# Altium footprint library CM3Board.PcbLib: 127 footprints (part 5 of 8)
Each footprint in its own frame and in the unit in brackets; x right, y up, seen from the top. Pads: shape width x height; smd on the part's side, far side on the other; paste and mask are expansions set on the pad; w line width, h text height; cw(c..) or ccw(c..) is an arc to the next point about the centre after c.
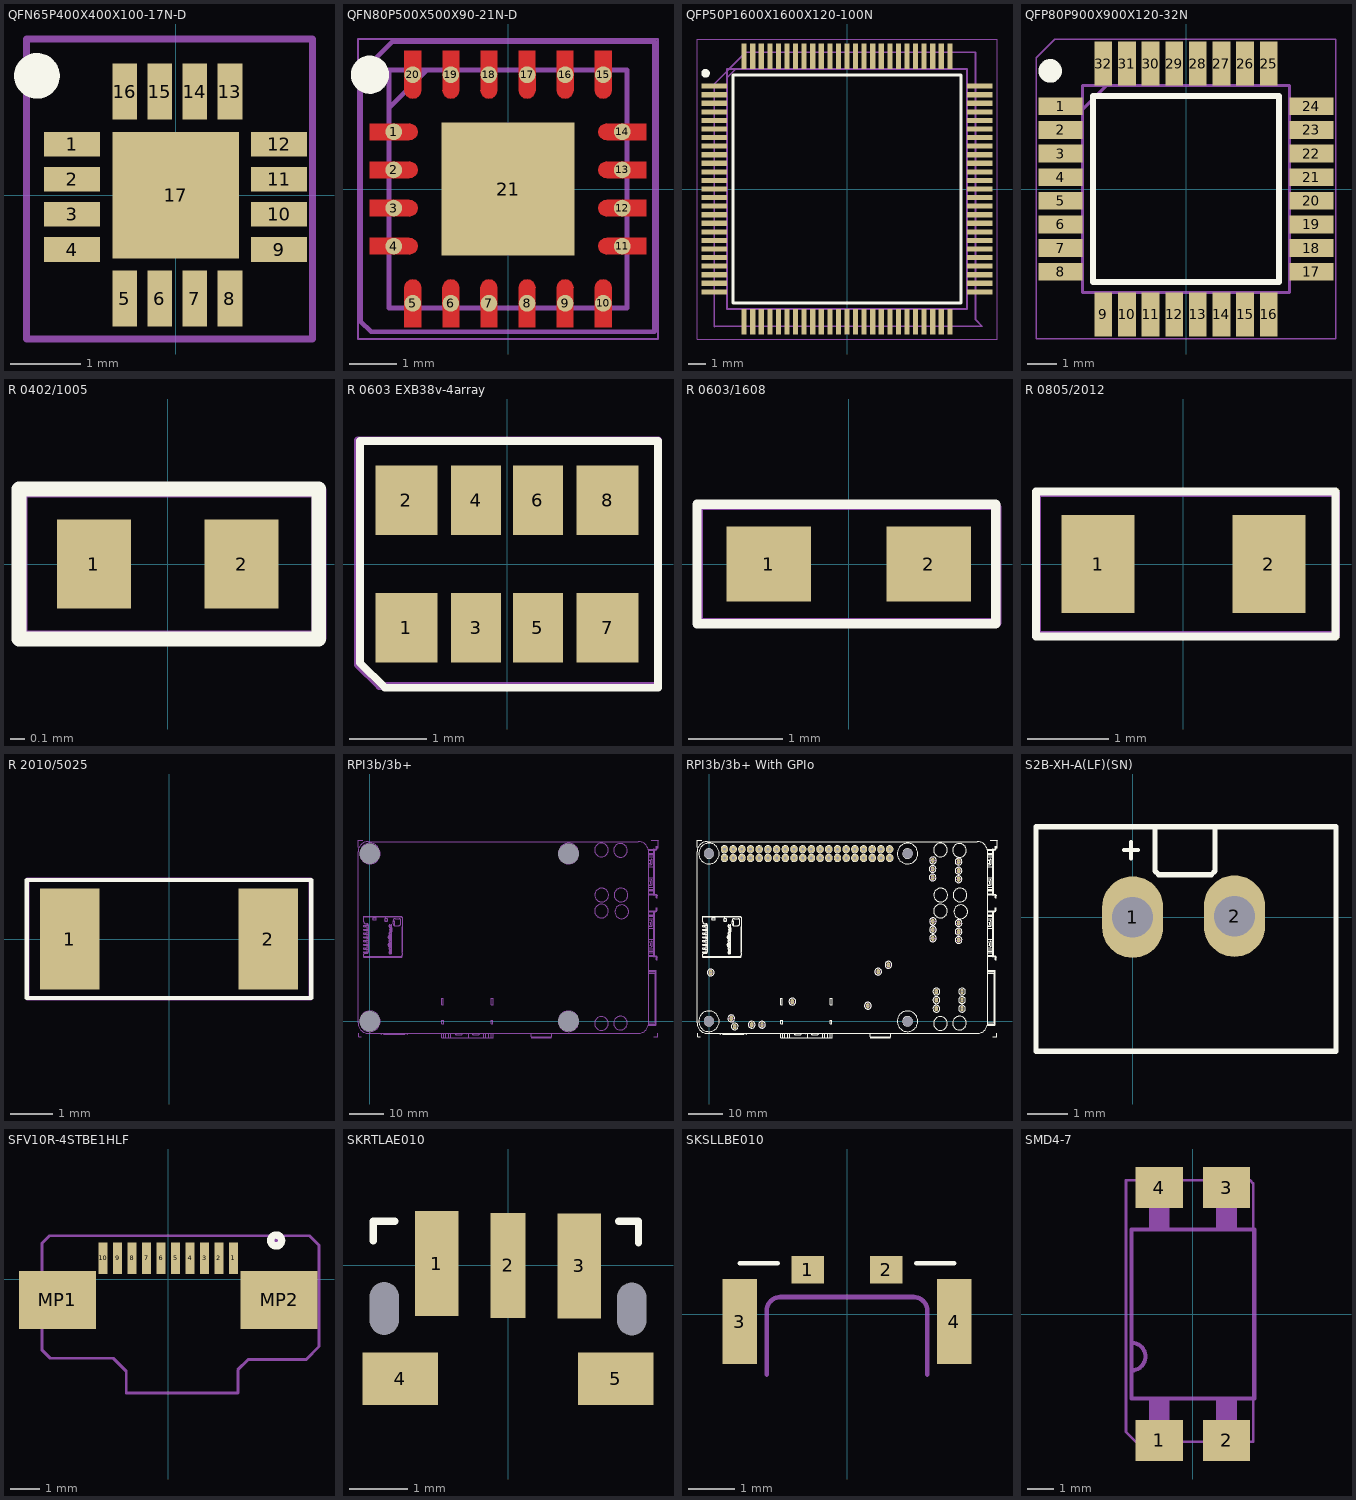
[diagram p4: the footprints below, top view; thin cyan lines are the x and y axes]

## QFN65P400X400X100-17N-D [mm]
pads (17):
  rect 0.8x0.35 smd: 1(-1.475,0.725) 2(-1.475,0.225) 3(-1.475,-0.275) 4(-1.475,-0.775) 9(1.475,-0.775) 10(1.475,-0.275) 11(1.475,0.225) 12(1.475,0.725)
  rect 0.35x0.8 smd: 5(-0.725,-1.475) 6(-0.225,-1.475) 7(0.275,-1.475) 8(0.775,-1.475) 13(0.775,1.475) 14(0.275,1.475) 15(-0.225,1.475) 16(-0.725,1.475)
  rect 1.8x1.8 smd: 17(0,0)
Top Overlay:
  circle w0.325: c-1.976,1.7 r0.162
Mechanical 29:
  lines w0.1: -2.125,-2.05 1.95,-2.05 1.95,2.225 -2.125,2.225 -2.125,-2.05
  text ".Designator" at -2.02,-0.8 h1
3D body "User Library-QFN-16.step": height 0.9, standoff 0, extent -1.501,-1.501 1.501,1.501

## QFN80P500X500X90-21N-D [mm]
pads (21):
  round 0.35 smd: 1(-2.4,1.2) 2(-2.4,0.4) 3(-2.4,-0.4) 4(-2.4,-1.2) 5(-2,-2.4) 6(-1.2,-2.4) 7(-0.4,-2.4) 8(0.4,-2.4) 9(1.2,-2.4) 10(2,-2.4) 11(2.4,-1.2) 12(2.4,-0.4) 13(2.4,0.4) 14(2.4,1.2) 15(2,2.4) 16(1.2,2.4) 17(0.4,2.4) 18(-0.4,2.4) 19(-1.2,2.4) 20(-2,2.4)
  rrect0% 2.8x2.8 smd: 21(0,0)
Top Layer:
  region: -2.9,1.375 -2.075,1.378 -2.007,1.365 -1.949,1.326 -1.91,1.268 -1.897,1.2 -1.91,1.132 -1.949,1.074 -2.007,1.035 -2.075,1.022 -2.075,1.025 -2.9,1.025
  region: -2.9,0.575 -2.075,0.578 -2.007,0.565 -1.949,0.526 -1.91,0.468 -1.897,0.4 -1.91,0.332 -1.949,0.274 -2.007,0.235 -2.075,0.222 -2.075,0.225 -2.9,0.225
  region: -2.9,-0.225 -2.075,-0.222 -2.007,-0.235 -1.949,-0.274 -1.91,-0.332 -1.897,-0.4 -1.91,-0.468 -1.949,-0.526 -2.007,-0.565 -2.075,-0.578 -2.075,-0.575 -2.9,-0.575
  region: -2.9,-1.025 -2.075,-1.022 -2.007,-1.035 -1.949,-1.074 -1.91,-1.132 -1.897,-1.2 -1.91,-1.268 -1.949,-1.326 -2.007,-1.365 -2.075,-1.378 -2.075,-1.375 -2.9,-1.375
  region: -2.175,-2.9 -2.178,-2.075 -2.165,-2.007 -2.126,-1.949 -2.068,-1.91 -2,-1.897 -1.932,-1.91 -1.874,-1.949 -1.835,-2.007 -1.822,-2.075 -1.825,-2.075 -1.825,-2.9
  region: -1.375,-2.9 -1.378,-2.075 -1.365,-2.007 -1.326,-1.949 -1.268,-1.91 -1.2,-1.897 -1.132,-1.91 -1.074,-1.949 -1.035,-2.007 -1.022,-2.075 -1.025,-2.075 -1.025,-2.9
  region: -0.575,-2.9 -0.578,-2.075 -0.565,-2.007 -0.526,-1.949 -0.468,-1.91 -0.4,-1.897 -0.332,-1.91 -0.274,-1.949 -0.235,-2.007 -0.222,-2.075 -0.225,-2.075 -0.225,-2.9
  region: 0.225,-2.9 0.222,-2.075 0.235,-2.007 0.274,-1.949 0.332,-1.91 0.4,-1.897 0.468,-1.91 0.526,-1.949 0.565,-2.007 0.578,-2.075 0.575,-2.075 0.575,-2.9
  region: 1.025,-2.9 1.022,-2.075 1.035,-2.007 1.074,-1.949 1.132,-1.91 1.2,-1.897 1.268,-1.91 1.326,-1.949 1.365,-2.007 1.378,-2.075 1.375,-2.075 1.375,-2.9
  region: 1.825,-2.9 1.822,-2.075 1.835,-2.007 1.874,-1.949 1.932,-1.91 2,-1.897 2.068,-1.91 2.126,-1.949 2.165,-2.007 2.178,-2.075 2.175,-2.075 2.175,-2.9
  region: 2.9,-1.375 2.075,-1.378 2.007,-1.365 1.949,-1.326 1.91,-1.268 1.897,-1.2 1.91,-1.132 1.949,-1.074 2.007,-1.035 2.075,-1.022 2.075,-1.025 2.9,-1.025
  region: 2.9,-0.575 2.075,-0.578 2.007,-0.565 1.949,-0.526 1.91,-0.468 1.897,-0.4 1.91,-0.332 1.949,-0.274 2.007,-0.235 2.075,-0.222 2.075,-0.225 2.9,-0.225
  region: 2.9,0.225 2.075,0.222 2.007,0.235 1.949,0.274 1.91,0.332 1.897,0.4 1.91,0.468 1.949,0.526 2.007,0.565 2.075,0.578 2.075,0.575 2.9,0.575
  region: 2.9,1.025 2.075,1.022 2.007,1.035 1.949,1.074 1.91,1.132 1.897,1.2 1.91,1.268 1.949,1.326 2.007,1.365 2.075,1.378 2.075,1.375 2.9,1.375
  region: 2.175,2.9 2.178,2.075 2.165,2.007 2.126,1.949 2.068,1.91 2,1.897 1.932,1.91 1.874,1.949 1.835,2.007 1.822,2.075 1.825,2.075 1.825,2.9
  region: 1.375,2.9 1.378,2.075 1.365,2.007 1.326,1.949 1.268,1.91 1.2,1.897 1.132,1.91 1.074,1.949 1.035,2.007 1.022,2.075 1.025,2.075 1.025,2.9
  region: 0.575,2.9 0.578,2.075 0.565,2.007 0.526,1.949 0.468,1.91 0.4,1.897 0.332,1.91 0.274,1.949 0.235,2.007 0.222,2.075 0.225,2.075 0.225,2.9
  region: -0.225,2.9 -0.222,2.075 -0.235,2.007 -0.274,1.949 -0.332,1.91 -0.4,1.897 -0.468,1.91 -0.526,1.949 -0.565,2.007 -0.578,2.075 -0.575,2.075 -0.575,2.9
  region: -1.025,2.9 -1.022,2.075 -1.035,2.007 -1.074,1.949 -1.132,1.91 -1.2,1.897 -1.268,1.91 -1.326,1.949 -1.365,2.007 -1.378,2.075 -1.375,2.075 -1.375,2.9
  region: -1.825,2.9 -1.822,2.075 -1.835,2.007 -1.874,1.949 -1.932,1.91 -2,1.897 -2.068,1.91 -2.126,1.949 -2.165,2.007 -2.178,2.075 -2.175,2.075 -2.175,2.9
Top Overlay:
  circle w0.4: c-2.9,2.4 r0.2
Mechanical 15:
  lines w0.1: -2.5,1.7 -1.7,2.5 ; -2.5,-2.5 2.5,-2.5 2.5,2.5 -2.5,2.5 -2.5,-2.5
Mechanical 20:
  lines w0.05: -3.15,-3.15 3.15,-3.15 3.15,3.15 -3.15,3.15 -3.15,-3.15
Mechanical 29:
  lines w0.1: -3.1,-2.775 -2.875,-3 3.075,-3 3.075,3.1 -2.425,3.1 -2.6,2.925 -3.1,2.425 -3.1,-2.775
  text ".Designator" at -1.475,-0.575 h1
3D body "SI3402-B-GM.stp": height 0.9, standoff 0, extent -2.525,-2.575 2.575,2.525

## QFP50P1600X1600X120-100N [mm]
pads (100):
  rect 1.5x0.3 smd: 1(-7.75,6) 2(-7.75,5.5) 3(-7.75,5) 4(-7.75,4.5) 5(-7.75,4) 6(-7.75,3.5) 7(-7.75,3) 8(-7.75,2.5) 9(-7.75,2) 10(-7.75,1.5) 11(-7.75,1) 12(-7.75,0.5) 13(-7.75,0) 14(-7.75,-0.5) 15(-7.75,-1) 16(-7.75,-1.5) 17(-7.75,-2) 18(-7.75,-2.5) 19(-7.75,-3) 20(-7.75,-3.5) 21(-7.75,-4) 22(-7.75,-4.5) 23(-7.75,-5) 24(-7.75,-5.5) 25(-7.75,-6) 51(7.75,-6) 52(7.75,-5.5) 53(7.75,-5) 54(7.75,-4.5) 55(7.75,-4) 56(7.75,-3.5) 57(7.75,-3) 58(7.75,-2.5) 59(7.75,-2) 60(7.75,-1.5) 61(7.75,-1) 62(7.75,-0.5) 63(7.75,0) 64(7.75,0.5) 65(7.75,1) 66(7.75,1.5) 67(7.75,2) 68(7.75,2.5) 69(7.75,3) 70(7.75,3.5) 71(7.75,4) 72(7.75,4.5) 73(7.75,5) 74(7.75,5.5) 75(7.75,6)
  rect 0.3x1.5 smd: 26(-6,-7.75) 27(-5.5,-7.75) 28(-5,-7.75) 29(-4.5,-7.75) 30(-4,-7.75) 31(-3.5,-7.75) 32(-3,-7.75) 33(-2.5,-7.75) 34(-2,-7.75) 35(-1.5,-7.75) 36(-1,-7.75) 37(-0.5,-7.75) 38(0,-7.75) 39(0.5,-7.75) 40(1,-7.75) 41(1.5,-7.75) 42(2,-7.75) 43(2.5,-7.75) 44(3,-7.75) 45(3.5,-7.75) 46(4,-7.75) 47(4.5,-7.75) 48(5,-7.75) 49(5.5,-7.75) 50(6,-7.75) 76(6,7.75) 77(5.5,7.75) 78(5,7.75) 79(4.5,7.75) 80(4,7.75) 81(3.5,7.75) 82(3,7.75) 83(2.5,7.75) 84(2,7.75) 85(1.5,7.75) 86(1,7.75) 87(0.5,7.75) 88(0,7.75) 89(-0.5,7.75) 90(-1,7.75) 91(-1.5,7.75) 92(-2,7.75) 93(-2.5,7.75) 94(-3,7.75) 95(-3.5,7.75) 96(-4,7.75) 97(-4.5,7.75) 98(-5,7.75) 99(-5.5,7.75) 100(-6,7.75)
Top Overlay:
  circle w0.25: c-8.25,6.75 r0.125
  lines w0.2: -6.65,-6.65 -6.65,6.65 6.65,6.65 6.65,-6.65 -6.65,-6.65
Mechanical 13:
  lines w0.1: -7,6.5 -6.5,7 ; -7,-7 -7,7 7,7 7,-7 -7,-7
Mechanical 15:
  lines w0.05: -8.75,-8.75 -8.75,8.75 8.75,8.75 8.75,-8.75 -8.75,-8.75
Mechanical 29:
  lines w0.1: -7.75,-8.025 -7.75,6.125 -5.925,7.95 -5.925,7.975 7.5,7.975 7.5,-7.625 7.875,-8 -7.725,-8 -7.75,-8.025
  text ".Designator" at -4.3,0.3 h1
3D body "ATMEGA1280-16AU.stp": height 1.2, standoff 0, extent -8,-8 8,8

## QFP80P900X900X120-32N [mm]
pads (32):
  rect 1.5x0.6 smd: 1(-4.25,2.8) 2(-4.25,2) 3(-4.25,1.2) 4(-4.25,0.4) 5(-4.25,-0.4) 6(-4.25,-1.2) 7(-4.25,-2) 8(-4.25,-2.8) 17(4.25,-2.8) 18(4.25,-2) 19(4.25,-1.2) 20(4.25,-0.4) 21(4.25,0.4) 22(4.25,1.2) 23(4.25,2) 24(4.25,2.8)
  rect 0.6x1.5 smd: 9(-2.8,-4.25) 10(-2,-4.25) 11(-1.2,-4.25) 12(-0.4,-4.25) 13(0.4,-4.25) 14(1.2,-4.25) 15(2,-4.25) 16(2.8,-4.25) 25(2.8,4.25) 26(2,4.25) 27(1.2,4.25) 28(0.4,4.25) 29(-0.4,4.25) 30(-1.2,4.25) 31(-2,4.25) 32(-2.8,4.25)
Top Overlay:
  circle w0.4: c-4.6,4 r0.2
  lines w0.2: -3.15,-3.15 -3.15,3.15 3.15,3.15 3.15,-3.15 -3.15,-3.15
Mechanical 13:
  lines w0.1: -3.5,2.7 -2.7,3.5 ; -3.5,-3.5 -3.5,3.5 3.5,3.5 3.5,-3.5 -3.5,-3.5
Mechanical 29:
  lines w0.05: -5.08,-5.08 -5.08,4.445 -4.445,5.08 5.08,5.08 5.08,-5.08 -5.08,-5.08
  text ".Designator" at -2.95,-0.375 h1
3D body "ATMEGA328P-AU.stp": height 1.2, standoff 0, extent -4.5,-4.5 4.5,4.5

## R 0402/1005 [mm]
pads (2):
  rect 0.5x0.6 smd: 1(-0.5,0) 2(0.5,0)
Top Overlay:
  lines w0.1: -1.008,-0.508 -1.008,0.508 1.024,0.508 1.024,-0.508 -1.008,-0.508
Mechanical 29:
  lines w0.1: -1,-0.5 1.025,-0.5 1.025,0.5 -1,0.5 -1,-0.5
  text ".Designator" at -0.85,-0.3 h0.6
3D body: height 0.64, standoff 0, extent 0.525,-0.3 0.75,0.3
3D body: height 0.64, standoff 0, extent -0.75,-0.3 -0.5,0.3
3D body: height 0.64, standoff 0, extent -0.5,-0.3 0.525,0.3

## R 0603 EXB38v-4array [mm]
pads (8):
  rect 0.8x0.9 smd: 1(-1.3,-0.825) 2(-1.3,0.825) 7(1.3,-0.825) 8(1.3,0.825)
  rect 0.65x0.9 smd: 3(-0.4,-0.825) 4(-0.4,0.825) 5(0.4,-0.825) 6(0.4,0.825)
Top Overlay:
  lines w0.1: -1.9,-1.275 -1.575,-1.6 1.95,-1.6 1.95,1.588 -1.9,1.588 -1.9,-1.275
Mechanical 29:
  lines w0.1: -1.925,-1.3 -1.65,-1.575 1.95,-1.575 1.95,1.6 -1.925,1.6 -1.925,-1.3
  text ".Designator" at -0.775,-0.175 h0.8
3D body "User Library-R-0603-Array-4-1.step": height 0.51, standoff -0.01, extent -1.6,-0.775 1.6,0.825

## R 0603/1608 [mm]
pads (2):
  rect 0.9x0.8 smd: 1(-0.85,0) 2(0.85,0)
Top Overlay:
  lines w0.1: -1.612,-0.635 1.563,-0.635 1.563,0.635 -1.612,0.635 -1.612,-0.635
Mechanical 29:
  lines w0.1: -1.6,-0.625 1.575,-0.625 1.575,0.6 1.55,0.625 -1.6,0.625 -1.6,-0.625
  text ".Designator" at -1.425,-0.4 h0.8
3D body: height 0.64, standoff 0, extent 0.85,-0.4 1.3,0.4
3D body: height 0.64, standoff 0, extent -1.3,-0.4 -0.85,0.4
3D body: height 0.64, standoff 0, extent -0.85,-0.4 0.85,0.4

## R 0805/2012 [mm]
pads (2):
  rect 0.9x1.2 smd: 1(-1.05,0) 2(1.05,0)
Top Overlay:
  lines w0.1: -1.812,-0.889 -1.812,0.889 1.871,0.889 1.871,-0.889 -1.812,-0.889
Mechanical 29:
  lines w0.1: -1.8,-0.875 -1.8,0.85 -1.775,0.875 1.875,0.875 1.875,-0.875 -1.8,-0.875
  text ".Designator" at -1.65,-0.55 h1
3D body: height 0.64, standoff 0, extent 1.1,-0.6 1.5,0.6
3D body: height 0.64, standoff 0, extent -1.5,-0.6 -1.05,0.6
3D body: height 0.64, standoff 0, extent -1.05,-0.6 1.1,0.6

## R 2010/5025 [mm]
pads (2):
  rect 1.4x2.4 smd: 1(-2.35,0) 2(2.35,0)
Top Overlay:
  lines w0.1: -3.366,-1.397 -3.366,1.397 3.365,1.397 3.365,-1.397 -3.366,-1.397
Mechanical 29:
  lines w0.1: -3.35,-1.4 -3.35,1.4 3.35,1.4 3.35,-1.4 -3.35,-1.4
  text ".Designator" at -3.1,-1.075 h1
3D body: height 0.64, standoff 0, extent -2.35,-1.2 2.35,1.2
3D body: height 0.64, standoff 0, extent -3.05,-1.2 -2.35,1.2
3D body: height 0.64, standoff 0, extent 2.35,-1.2 3.05,1.2

## RPI3b/3b+ [mm]
pads (4):
  round 0 hole 6 unplated: ""(0,0) ""(0,49) ""(58,0) ""(58,49)
Mechanical 29:
  drawing of 6158 lines, arcs and shapes, not listed
  text ".Designator" at 28.997,25.979 h1

## RPI3b/3b+ With GPIo [mm]
pads (71):
  round 1.524 hole 3: 1(0,0) 2(58.025,-0.05) 3(58.025,49.025) 4(0,49.025)
  round 2 hole 0.78: 10(4.505,47.725) 10(4.505,50.265) 10(7.045,47.725) 10(7.045,50.265) 10(9.585,47.725) 10(9.585,50.265) 10(12.125,47.725) 10(12.125,50.265) 10(14.665,47.725) 10(14.665,50.265) 10(17.205,47.725) 10(17.205,50.265) 10(19.754,47.725) 10(19.754,50.265) 10(22.285,47.725) 10(22.285,50.265) 10(24.825,47.725) 10(24.825,50.265) 10(27.365,47.725) 10(27.365,50.265) 10(29.905,47.725) 10(29.905,50.265) 10(32.445,47.725) 10(32.445,50.265) 10(34.985,47.725) 10(34.985,50.265) 10(37.525,47.725) 10(37.525,50.265) 10(40.065,47.725) 10(40.065,50.265) 10(42.605,47.725) 10(42.605,50.265) 10(45.145,47.725) 10(45.145,50.265) 10(47.685,47.725) 10(47.685,50.265) 10(50.225,47.725) 10(50.225,50.265) 10(52.765,47.725) 10(52.765,50.265)
  oval 1x1.5 hole 0.5: Pi4-1(66.407,3.692) Pi4-2(66.407,6.192) Pi4-3(73.907,3.692) Pi4-4(73.907,6.192) Pi4-5(66.407,8.692) Pi4-6(73.907,8.692) PP2(6.485,0.86) PP3(15.48,-0.99) PP4(24.33,5.76) PP5(7.5,-1.525) PP6(46.41,4.56) PP10(0.479,14.26) PP13(12.475,-1) PP25(49.41,14.51) PP26(52.41,16.51) PP36(65.41,24.25) PP41(65.41,26.76) PP42(72.909,23.76) PP43(72.909,26.2) PP44(65.309,42) PP45(65.309,44.51) PP46(72.909,41.51) PP47(72.909,44.02) PP48(72.909,46.66) PP49(65.409,47.02) PP50(65.41,29.21) PP51(72.909,28.71)
Top Overlay:
  drawing of 6710 lines, arcs and shapes, not listed
Mechanical 1:
  lines w0.1: -0.456,14.25 0.48,14.25 ; 0.479,13.325 0.479,14.25 ; 0.479,15.2 0.479,14.25 ; 1.419,14.25 0.48,14.25 ; 5.55,0.85 6.486,0.85 ; 6.485,-0.075 6.485,0.85 ; 6.485,1.8 6.485,0.85 ; 7.425,0.85 6.486,0.85 ; 11.54,-1.01 12.476,-1.01 ; 12.475,-1.935 12.475,-1.01 ; 12.475,-0.06 12.475,-1.01 ; 13.415,-1.01 12.476,-1.01 ; 14.545,-1 15.481,-1 ; 15.48,-1.925 15.48,-1 ; 15.48,-0.05 15.48,-1 ; 16.42,-1 15.481,-1 ; 23.395,5.75 24.331,5.75 25.27,5.75 ; 24.33,4.825 24.33,5.75 24.33,6.7 ; 45.475,4.55 46.411,4.55 47.35,4.55 ; 46.41,3.625 46.41,4.55 46.41,5.5 ; 48.475,14.5 49.411,14.5 ; 49.41,13.575 49.41,14.5 ; 49.41,15.45 49.41,14.5 ; 50.35,14.5 49.411,14.5 ; 51.475,16.5 52.411,16.5 ; 52.41,15.575 52.41,16.5 ; 52.41,17.45 52.41,16.5 ; 53.35,16.5 52.411,16.5 ; 64.374,41.99 65.31,41.99 ; 64.374,44.5 65.31,44.5 ; 64.474,47.01 65.41,47.01 66.349,47.01 ; 64.475,24.24 65.411,24.24 ; 64.475,26.75 65.411,26.75 ; 64.475,29.2 65.411,29.2 ; 65.309,41.065 65.309,41.99 ; 65.309,42.94 65.309,41.99 ; 65.309,43.575 65.309,44.5 ; 65.309,45.45 65.309,44.5 ; 65.409,46.085 65.409,47.01 65.409,47.96 ; 65.41,23.315 65.41,24.24 ; 65.41,25.19 65.41,24.24 ; 65.41,25.825 65.41,26.75 ; 65.41,27.7 65.41,26.75 ; 65.41,28.275 65.41,29.2 ; 65.41,30.15 65.41,29.2 ; 66.249,41.99 65.31,41.99 ; 66.249,44.5 65.31,44.5 ; 66.35,24.24 65.411,24.24 ; 66.35,26.75 65.411,26.75 ; 66.35,29.2 65.411,29.2 ; 71.974,23.75 72.91,23.75 ; 71.974,26.19 72.91,26.19 ; 71.974,28.7 72.91,28.7 ; 71.974,41.5 72.91,41.5 ; 71.974,44.01 72.91,44.01 ; 71.974,46.65 72.91,46.65 ; 72.909,22.825 72.909,23.75 ; 72.909,24.7 72.909,23.75 ; 72.909,25.265 72.909,26.19 ; 72.909,27.14 72.909,26.19 ; 72.909,27.775 72.909,28.7 ; 72.909,29.65 72.909,28.7 ; 72.909,40.575 72.909,41.5 ; 72.909,42.45 72.909,41.5 ; 72.909,43.085 72.909,44.01 ; 72.909,44.96 72.909,44.01 ; 72.909,45.725 72.909,46.65 ; 72.909,47.6 72.909,46.65 ; 73.849,23.75 72.91,23.75 ; 73.849,26.19 72.91,26.19 ; 73.849,28.7 72.91,28.7 ; 73.849,41.5 72.91,41.5 ; 73.849,44.01 72.91,44.01 ; 73.849,46.65 72.91,46.65 ; 6.485,0.85 6.486,0.85 ; 6.485,0.85 6.486,0.85
Mechanical 29:
  text ".Designator" at 28.98,25.99 h1
3D body "mill-max-0906-1-15-20-75-14-11-0.step": height 4.5, standoff -1.75, extent 64.395,41.076 66.224,42.904
3D body "mill-max-0906-1-15-20-75-14-11-0.step": height 4.5, standoff -1.75, extent 64.396,43.586 66.224,45.414
3D body "mill-max-0906-1-15-20-75-14-11-0.step": height 4.5, standoff -1.75, extent 64.496,46.096 66.324,47.924
3D body "mill-max-0906-1-15-20-75-14-11-0.step": height 4.5, standoff -1.75, extent 71.995,45.746 73.824,47.574
3D body "mill-max-0906-1-15-20-75-14-11-0.step": height 4.5, standoff -1.75, extent 71.996,43.096 73.824,44.924
3D body "mill-max-0906-1-15-20-75-14-11-0.step": height 4.5, standoff -1.75, extent 71.995,40.586 73.824,42.414
3D body "mill-max-0906-1-15-20-75-14-11-0.step": height 4.5, standoff -1.75, extent 71.995,22.836 73.824,24.664
3D body "mill-max-0906-1-15-20-75-14-11-0.step": height 4.5, standoff -1.75, extent 71.996,25.276 73.824,27.104
3D body "mill-max-0906-1-15-20-75-14-11-0.step": height 4.5, standoff -1.75, extent 71.995,27.796 73.824,29.624
3D body "mill-max-0906-1-15-20-75-14-11-0.step": height 4.5, standoff -1.75, extent 64.496,28.296 66.324,30.124
3D body "mill-max-0906-1-15-20-75-14-11-0.step": height 4.5, standoff -1.75, extent 64.496,25.846 66.324,27.674
3D body "mill-max-0906-1-15-20-75-14-11-0.step": height 4.5, standoff -1.75, extent 64.496,23.326 66.325,25.154
3D body "mill-max-0906-1-15-20-75-14-11-0.step": height 4.5, standoff -1.75, extent 51.496,15.596 53.324,17.424
3D body "mill-max-0906-1-15-20-75-14-11-0.step": height 4.5, standoff -1.75, extent 48.496,13.586 50.325,15.414
3D body "mill-max-0906-1-15-20-75-14-11-0.step": height 4.5, standoff -1.75, extent 45.496,3.636 47.325,5.464
3D body "mill-max-0906-1-15-20-75-14-11-0.step": height 4.5, standoff -1.75, extent 23.416,4.846 25.244,6.674
3D body "mill-max-0906-1-15-20-75-14-11-0.step": height 4.5, standoff -1.75, extent -0.435,13.346 1.394,15.174
3D body "mill-max-0906-1-15-20-75-14-11-0.step": height 4.5, standoff -1.75, extent 5.571,-0.064 7.399,1.764
3D body "mill-max-0906-1-15-20-75-14-11-0.step": height 4.5, standoff -1.75, extent 14.566,-1.904 16.394,-0.076
3D body "mill-max-0906-1-15-20-75-14-11-0.step": height 4.5, standoff -1.75, extent 11.561,-1.924 13.39,-0.096
3D body "mill-max-0906-1-15-20-75-14-11-0.step": height 4.5, standoff -1.75, extent 6.586,-2.439 8.414,-0.611
3D body "SDL-120-T-10.stp": height 3.14, standoff -2.71, extent 3.23,46.44 54.03,51.52

## S2B-XH-A(LF)(SN) [mm]
pads (2):
  oval 1.5x2 hole 1: 1(0,0) 2(2.5,0.025)
Top Overlay:
  lines w0.1: -0.21,1.65 0.13,1.65 ; -0.04,1.44 -0.04,1.84
  lines w0.127: 0.55,2.22 0.55,1.136 0.64,1.046 0.64,1.04 1.93,1.04 2.02,1.13 2.02,2.22 ; -2.37,-3.29 4.99,-3.29 4.99,2.22 -2.37,2.22 -2.37,-3.29
Mechanical 29:
  text "PAD" at 0.825,-0.375 h1
3D body "S2B-XH-A(LF)(SN)--3DModel-STEP-56544.STEP": height 6.25, standoff -3.3, extent -2.42,-9.23 4.98,2.27

## SFV10R-4STBE1HLF [mm]
pads (12):
  rect 0.3x1.1 smd: 1(2.25,0.717) 2(1.75,0.717) 3(1.25,0.717) 4(0.75,0.717) 5(0.25,0.717) 6(-0.25,0.717) 7(-0.75,0.717) 8(-1.25,0.717) 9(-1.75,0.717) 10(-2.25,0.717)
  rect 2.65x2 smd: MP1(-3.825,-0.717) MP2(3.825,-0.717)
Top Overlay:
  circle w0.254: c3.72,1.33 r0.19
Mechanical 29:
  circle w0.254: c3.72,1.29 r0.056
  lines w0.1: -4.35,-2.458 -4.35,1.242 -4.1,1.492 4.875,1.492 5.2,1.168 5.2,-2.332 4.75,-2.783 2.75,-2.783 2.4,-3.133 2.4,-3.933 -1.45,-3.933 -1.45,-3.183 -1.9,-2.733 -4.075,-2.733 -4.35,-2.458
  text ".Designator" at -3.4,-1.082 h1
3D body "ssfv10r_4stlf.stp": height 1.92, standoff 0.05, extent -5.28,-3.89 5.22,1.01

## SKRTLAE010 [mm]
pads (7):
  rect 0.75x1.8 smd: 1(-1.225,0.03) 3(1.225,-0.01)
  rect 0.6x1.8 smd: 2(0,0)
  round 0 hole 0.5 slot 0.9 at 90 deg: 4(-2.125,-0.74) 5(2.125,-0.75)
  rect 1.3x0.9 smd: 4(-1.85,-1.95) 5(1.85,-1.95)
Top Overlay:
  lines w0.127: -2.31,0.42 -2.31,0.76 -1.94,0.76 ; 1.9,0.76 2.24,0.76 2.24,0.39
Mechanical 29:
  text ".Designator" at -1.44,-1.5 h1
3D body "SKRTLA.STEP": height 3.4, standoff -0.4, extent -2.24,-2.81 2.26,0.74

## SKSLLBE010 [mm]
pads (4):
  rect 0.7x0.6 smd: 1(-0.85,0.963) 2(0.85,0.963)
  rect 0.75x1.85 smd: 3(-2.325,-0.162) 4(2.325,-0.162)
Top Overlay:
  lines w0.1: -2.325,1.1 -1.5,1.1 ; 1.5,1.1 2.325,1.1
Mechanical 8:
  lines w0.1: -1.74,-1.31 -1.74,0.07 cw(c-1.44,0.07) -1.44,0.37 1.44,0.37 cw(c1.44,0.07) 1.74,0.07 1.74,-1.31
Mechanical 29:
  text ".Designator" at -1.57,-0.74 h1
3D body "SKSLLB.STEP": height 1.71, standoff -0.51, extent -2.23,-1.91 2.27,1.09

## SMD4-7 [mm] "SMD4-7"
pads (4):
  rect 1.78x1.55 smd: 1(-1.27,-4.77) 2(1.27,-4.77) 3(1.27,4.77) 4(-1.27,4.77)
Mechanical 8:
  region: -0.889,5.15 -0.889,3.2 -1.651,3.2 -1.651,5.15
  region: 1.651,5.15 1.651,3.2 0.889,3.2 0.889,5.15
  region: 0.889,-5.15 0.889,-3.2 1.651,-3.2 1.651,-5.15
  region: -1.651,-5.15 -1.651,-3.2 -0.889,-3.2 -0.889,-5.15
Mechanical 16:
  lines w0.152: -2.315,-2.13 ccw(c-2.315,-1.608) -2.315,-1.085 ; -2.315,-2.13 -2.315,-1.085 ; -2.315,-2.13 -2.315,-3.18 2.315,-3.18 2.315,3.18 -2.315,3.18 -2.315,-1.085
Mechanical 29:
  lines w0.1: -2.525,-4.45 -2.525,5.05 2.15,5.05 2.275,4.925 2.275,-4.825 -2.15,-4.825 -2.525,-4.45
  text ".Designator" at -0.425,-0.425 h1